# Altium footprint library CubeSat-Backplane.PcbLib: 54 footprints (part 1 of 4)
Each footprint in its own frame and in the unit in brackets; x right, y up, seen from the top. Pads: shape width x height; smd on the part's side, far side on the other; paste and mask are expansions set on the pad; w line width, h text height; cw(c..) or ccw(c..) is an arc to the next point about the centre after c.
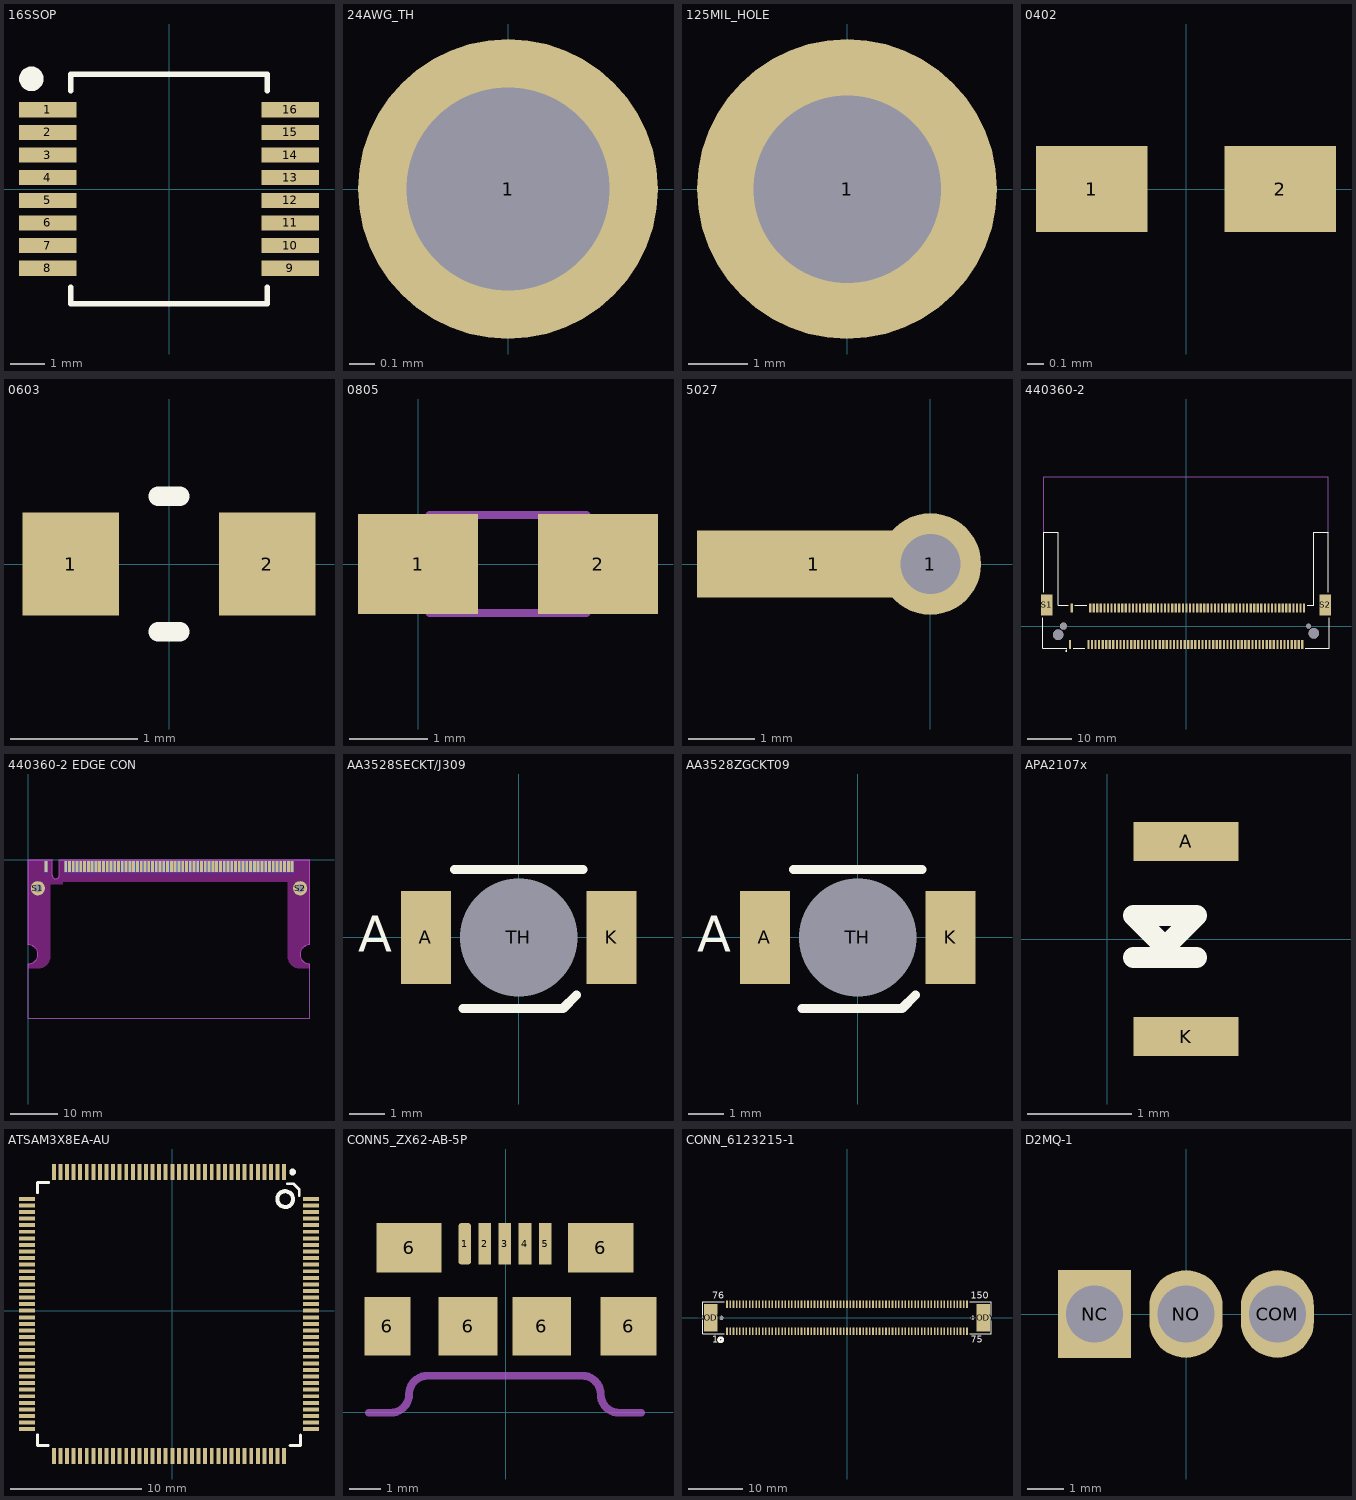
[diagram p0: the footprints below, top view; thin cyan lines are the x and y axes]

## 16SSOP [mil] "16-SSOP (0.209\", 5.30mm Width)"
height 43.31
pads (16):
  rect 65x17 smd mask+2.36: 1(-137,89.57) 2(-137,63.98) 3(-137,38.39) 4(-137,12.8) 5(-137,-12.8) 6(-137,-38.39) 7(-137,-63.98) 8(-137,-89.57) 9(137,-89.57) 10(137,-63.98) 11(137,-38.39) 12(137,-12.8) 13(137,12.8) 14(137,38.39) 15(137,63.98) 16(137,89.57)
Top Overlay:
  circle w19.68: c-155.5,124.49 r3.94
  lines w6: -111,-111.17 -111,-129.5 111,-129.5 111,-111.17 ; -111,111.17 -111,129.5 111,129.5 111,111.17
3D body "21-0056C_16.step": height 79.11, standoff 1, extent -155.5,-124.48 155.52,124.49

## 24AWG_TH [mm] "TH SOLDER PAD FOR 24AWG"
pads (1):
  round 1.2 hole 0.813: 1(0,0)

## 125MIL_HOLE [mm]
pads (1):
  round 5.08 hole 3.175: 1(0,0)

## 0402 [mil]
pads (2):
  rect 26x20 smd: 1(-22,0) 2(22,0)
3D body: height 10, standoff 0, extent 0,0 10,10
3D body "RC0402N.step": height 27.99, standoff 0, extent -20.98,-9.99 20.99,10.01

## 0603 [mil] "Non-polarized"
height 35.43
pads (2):
  rect 29.78x32 smd paste+0 mask+0: 1(-30.39,0) 2(30.39,0)
Top Overlay:
  lines w6: -3.39,-21 3.39,-21 ; -3.39,21 3.39,21
3D body "User Library-res0603-1.step": height 15.75, standoff 0, extent -31.49,-15.74 31.51,15.75
3D body: height 10, standoff 0, extent 0,0 10,10

## 0805 [mil] "Non-Polarized"
pads (2):
  rect 60x50 smd: 1(0,0) 2(90,0)
BOARD CHAMFER:
  lines w4: 5.63,-24.61 5.63,24.61 84.37,24.61 84.37,-24.61 5.63,-24.61
3D body: height 36, standoff 0, extent 5.63,-24.61 84.37,24.61

## 5027 [mm] "PC Test Point, Miniature Phosphor Bronze, Silver Plating Surface Mount, Through Hole Mounting Type"
height 3.05
pads (2):
  rect 3.5x1 smd mask+0: 1(-1.75,0)
  round 1.524 hole 0.9 mask+0.05: 1(0,0)
Top Paste:
  rectangle: -1,-1 1,1
3D body "keystone-PN5027.STEP": height 3.06, standoff -1, extent -3.209,-0.381 0.144,0.381

## 440360-2 [mm] "124 Position SODIMM Fax Modem, Mini PCI Socket Surface Mount, Right Angle"
height 7.95
pads (130):
  rect 0.5x2 smd: 1(-26.05,-4.1) 2(-25.65,4.1) 3(-21.9,-4.1) 4(-21.5,4.1) 5(-21.1,-4.1) 6(-20.7,4.1) 7(-20.3,-4.1) 8(-19.9,4.1) 9(-19.5,-4.1) 10(-19.1,4.1) 11(-18.7,-4.1) 12(-18.3,4.1) 13(-17.9,-4.1) 14(-17.5,4.1) 15(-17.1,-4.1) 16(-16.7,4.1) 17(-16.3,-4.1) 18(-15.9,4.1) 19(-15.5,-4.1) 20(-15.1,4.1) 21(-14.7,-4.1) 22(-14.3,4.1) 23(-13.9,-4.1) 24(-13.5,4.1) 25(-13.1,-4.1) 26(-12.7,4.1) 27(-12.3,-4.1) 28(-11.9,4.1) 29(-11.5,-4.1) 30(-11.1,4.1) 31(-10.7,-4.1) 32(-10.3,4.1) 33(-9.9,-4.1) 34(-9.5,4.1) 35(-9.1,-4.1) 36(-8.7,4.1) 37(-8.3,-4.1) 38(-7.9,4.1) 39(-7.5,-4.1) 40(-7.1,4.1) 41(-6.7,-4.1) 42(-6.3,4.1) 43(-5.9,-4.1) 44(-5.5,4.1) 45(-5.1,-4.1) 46(-4.7,4.1) 47(-4.3,-4.1) 48(-3.9,4.1) 49(-3.5,-4.1) 50(-3.1,4.1) 51(-2.7,-4.1) 52(-2.3,4.1) 53(-1.9,-4.1) 54(-1.5,4.1) 55(-1.1,-4.1) 56(-0.7,4.1) 57(-0.3,-4.1) 58(0.1,4.1) 59(0.5,-4.1) 60(0.9,4.1) 61(1.3,-4.1) 62(1.7,4.1) 63(2.1,-4.1) 64(2.5,4.1) 65(2.9,-4.1) 66(3.3,4.1) 67(3.7,-4.1) 68(4.1,4.1) 69(4.5,-4.1) 70(4.9,4.1) 71(5.3,-4.1) 72(5.7,4.1) 73(6.1,-4.1) 74(6.5,4.1) 75(6.9,-4.1) 76(7.3,4.1) 77(7.7,-4.1) 78(8.1,4.1) 79(8.5,-4.1) 80(8.9,4.1) 81(9.3,-4.1) 82(9.7,4.1) 83(10.1,-4.1) 84(10.5,4.1) 85(10.9,-4.1) 86(11.3,4.1) 87(11.7,-4.1) 88(12.1,4.1) 89(12.5,-4.1) 90(12.9,4.1) 91(13.3,-4.1) 92(13.7,4.1) 93(14.1,-4.1) 94(14.5,4.1) 95(14.9,-4.1) 96(15.3,4.1) 97(15.7,-4.1) 98(16.1,4.1) 99(16.5,-4.1) 100(16.9,4.1) 101(17.3,-4.1) 102(17.7,4.1) 103(18.1,-4.1) 104(18.5,4.1) 105(18.9,-4.1) 106(19.3,4.1) 107(19.7,-4.1) 108(20.1,4.1) 109(20.5,-4.1) 110(20.9,4.1) 111(21.3,-4.1) 112(21.7,4.1) 113(22.1,-4.1) 114(22.5,4.1) 115(22.9,-4.1) 116(23.3,4.1) 117(23.7,-4.1) 118(24.1,4.1) 119(24.5,-4.1) 120(24.9,4.1) 121(25.3,-4.1) 122(25.7,4.1) 123(26.1,-4.1) 124(26.5,4.1)
  round 2.35 hole 2.35 unplated: None(-28.675,-1.93) None(28.675,-1.63)
  round 1.6 hole 1.6 unplated: None(-27.5,0)
  round 1.1 hole 1.1 unplated: None(27.5,0)
  rect 2.5x4.8 smd: S1(-31.25,4.75) S2(31.25,4.75)
Top Overlay:
  circle w0.2: c-26.85,-5.55 r0.1
  lines w0.254: -32.1,1.9 -32.1,-4.97 -26.8,-4.97 ; -31.95,7.65 -31.95,21.03 -28.65,21.03 -28.65,4.65 -26.4,4.65 ; -25.3,-4.97 -22.7,-4.97 ; -24.95,4.65 -22.25,4.65 ; 26.8,-4.97 32.1,-4.97 32.1,1.9 ; 27.2,4.65 28.65,4.65 28.65,21.03 31.95,21.03 31.95,7.65
Mechanical 1:
  lines w0.254: -31.95,21.03 -31.95,33.528 31.95,33.528 31.95,21.03
3D body "c-440360-2-m-3d.stp": height 8.85, standoff -0.59, extent -32.1,-4.975 32.1,20.94

## 440360-2 EDGE CON [mm]
pads (126):
  rect 0.6x2.3 smd: A1(3.75,-1.4) A2(7.9,-1.4) A3(8.7,-1.4) A4(9.5,-1.4) A5(10.3,-1.4) A6(11.1,-1.4) A7(11.9,-1.4) A8(12.7,-1.4) A9(13.5,-1.4) A10(14.3,-1.4) A11(15.1,-1.4) A12(15.9,-1.4) A13(16.7,-1.4) A14(17.5,-1.4) A15(18.3,-1.4) A16(19.1,-1.4) A17(19.9,-1.4) A18(20.7,-1.4) A19(21.5,-1.4) A20(22.3,-1.4) A21(23.1,-1.4) A22(23.9,-1.4) A23(24.7,-1.4) A24(25.5,-1.4) A25(26.3,-1.4) A26(27.1,-1.4) A27(27.9,-1.4) A28(28.7,-1.4) A29(29.5,-1.4) A30(30.3,-1.4) A31(31.1,-1.4) A32(31.9,-1.4) A33(32.7,-1.4) A34(33.5,-1.4) A35(34.3,-1.4) A36(35.1,-1.4) A37(35.9,-1.4) A38(36.7,-1.4) A39(37.5,-1.4) A40(38.3,-1.4) A41(39.1,-1.4) A42(39.9,-1.4) A43(40.7,-1.4) A44(41.5,-1.4) A45(42.3,-1.4) A46(43.1,-1.4) A47(43.9,-1.4) A48(44.7,-1.4) A49(45.5,-1.4) A50(46.3,-1.4) A51(47.1,-1.4) A52(47.9,-1.4) A53(48.7,-1.4) A54(49.5,-1.4) A55(50.3,-1.4) A56(51.1,-1.4) A57(51.9,-1.4) A58(52.7,-1.4) A59(53.5,-1.4) A60(54.3,-1.4) A61(55.1,-1.4) A62(55.9,-1.4)
  rect 0.6x2.3 smd far side: B1(3.75,-1.4) B2(7.9,-1.4) B3(8.7,-1.4) B4(9.5,-1.4) B5(10.3,-1.4) B6(11.1,-1.4) B7(11.9,-1.4) B8(12.7,-1.4) B9(13.5,-1.4) B10(14.3,-1.4) B11(15.1,-1.4) B12(15.9,-1.4) B13(16.7,-1.4) B14(17.5,-1.4) B15(18.3,-1.4) B16(19.1,-1.4) B17(19.9,-1.4) B18(20.7,-1.4) B19(21.5,-1.4) B20(22.3,-1.4) B21(23.1,-1.4) B22(23.9,-1.4) B23(24.7,-1.4) B24(25.5,-1.4) B25(26.3,-1.4) B26(27.1,-1.4) B27(27.9,-1.4) B28(28.7,-1.4) B29(29.5,-1.4) B30(30.3,-1.4) B31(31.1,-1.4) B32(31.9,-1.4) B33(32.7,-1.4) B34(33.5,-1.4) B35(34.3,-1.4) B36(35.1,-1.4) B37(35.9,-1.4) B38(36.7,-1.4) B39(37.5,-1.4) B40(38.3,-1.4) B41(39.1,-1.4) B42(39.9,-1.4) B43(40.7,-1.4) B44(41.5,-1.4) B45(42.3,-1.4) B46(43.1,-1.4) B47(43.9,-1.4) B48(44.7,-1.4) B49(45.5,-1.4) B50(46.3,-1.4) B51(47.1,-1.4) B52(47.9,-1.4) B53(48.7,-1.4) B54(49.5,-1.4) B55(50.3,-1.4) B56(51.1,-1.4) B57(51.9,-1.4) B58(52.7,-1.4) B59(53.5,-1.4) B60(54.3,-1.4) B61(55.1,-1.4) B62(55.9,-1.4)
  round 3 hole 1.8: S1(2,-6) S2(57.6,-6)
Keep-Out Layer:
  region: 6.55,0 6.55,-3.25 6.546,-3.323 6.518,-3.468 6.461,-3.604 6.38,-3.726 6.276,-3.83 6.154,-3.911 6.018,-3.968 5.873,-3.996 5.8,-4 5.726,-3.996 5.582,-3.968 5.446,-3.911 5.324,-3.83 5.22,-3.726 5.139,-3.604 5.082,-3.468 5.054,-3.324 5.05,-3.25 5.05,0 0,0 0,-18 0.196,-18.01 0.581,-18.086 0.943,-18.236 1.269,-18.454 1.546,-18.731 1.764,-19.057 1.914,-19.419 1.99,-19.804 1.99,-20.196 1.914,-20.581 1.764,-20.943 1.546,-21.269 1.269,-21.546 0.943,-21.764 0.581,-21.914 0.196,-21.99 0,-22 0,-23 2.256,-23 2.479,-22.975 2.91,-22.851 3.314,-22.657 3.68,-22.397 3.997,-22.08 4.257,-21.714 4.451,-21.31 4.575,-20.879 4.6,-20.656 4.6,-5.1 7.3,-5.1 7.3,-4.6 55,-4.6 55,-20.656 55.025,-20.879 55.149,-21.31 55.343,-21.714 55.603,-22.08 55.92,-22.397 56.286,-22.657 56.69,-22.851 57.121,-22.975 57.344,-23 59.6,-23 59.6,-22 59.404,-21.991 59.019,-21.914 58.656,-21.765 58.33,-21.547 58.052,-21.27 57.834,-20.943 57.684,-20.581 57.607,-20.196 57.607,-19.804 57.684,-19.419 57.834,-19.057 58.052,-18.73 58.33,-18.453 58.656,-18.235 59.019,-18.086 59.404,-18.009 59.6,-18 59.6,0
Mechanical 1:
  lines w0.254: 0,-23 0,-33.5 59.6,-33.5 59.6,-23 ; 59.6,-23 59.6,-23
Board:
  lines w0.254: 0,-23 0,-22 ; 59.6,-23 59.6,-22 ; 0,-22 ccw(c0,-20) 0,-18 0,0 5.05,0 5.05,-3.25 ccw(c5.8,-3.25) 5.8,-4 ccw(c5.8,-3.25) 6.55,-3.25 6.55,0 59.6,0 59.6,-18 ccw(c59.6,-20) 59.6,-22 ; 0,-22 0,-22 ; 59.6,-22 59.6,-22

## AA3528SECKT/J309 [mm] "Red 625nm LED Indication - Discrete 2.2V 2-SMD, Gull Wing, Reverse Mount"
pads (3):
  rect 1.4x2.6 smd: A(-2.6,0) K(2.6,0)
  round 1.524 hole 3.3 unplated: TH(0,0)
Top Overlay:
  lines w0.254: -1.8,1.9 1.8,1.9 ; -1.56,-1.993 1.24,-1.993 1.616,-1.617
  text "A" at -4.5,-0.4 h1.02
3D body "RED_LED.SLDPRT": height 1.91, standoff 0.01, extent -2.6,-1.403 2.6,1.397

## AA3528ZGCKT09 [mm] "Green 525nm LED Indication - Discrete 2.2V 2-SMD, Gull Wing, Reverse Mount"
pads (3):
  rect 1.4x2.6 smd: A(-2.6,0) K(2.6,0)
  round 1.524 hole 3.3 unplated: TH(0,0)
Top Overlay:
  lines w0.254: -1.8,1.9 1.8,1.9 ; -1.56,-1.993 1.24,-1.993 1.616,-1.617
  text "A" at -4.5,-0.4 h1.02
3D body "GREEN_LED.SLDPRT": height 1.91, standoff 0.01, extent -2.6,-1.403 2.6,1.397

## APA2107x [mm] "Red 625nm LED Indication - Discrete 1.8V 2-SMD, No Lead"
height 0.7
pads (2):
  rect 1x0.37 smd: A(0.75,0.93) K(0.75,-0.93)
Top Overlay:
  lines w0.2: 0.25,-0.175 0.85,-0.175 ; 0.25,0.225 0.85,0.225 0.55,-0.075 0.25,0.225
3D body "APA2107.STEP": height 0.61, standoff 0.01, extent 0,-1.05 1.001,1.05

## ATSAM3X8EA-AU [mm] "IC MCU 32BIT 512KB FLASH 144LQFP"
pads (144):
  rect 0.3x1.2 smd: 1(8.5,10.55) 2(8,10.55) 3(7.5,10.55) 4(7,10.55) 5(6.5,10.55) 6(6,10.55) 7(5.5,10.55) 8(5,10.55) 9(4.5,10.55) 10(4,10.55) 11(3.5,10.55) 12(3,10.55) 13(2.5,10.55) 14(2,10.55) 15(1.5,10.55) 16(1,10.55) 17(0.5,10.55) 18(0,10.55) 19(-0.5,10.55) 20(-1,10.55) 21(-1.5,10.55) 22(-2,10.55) 23(-2.5,10.55) 24(-3,10.55) 25(-3.5,10.55) 26(-4,10.55) 27(-4.5,10.55) 28(-5,10.55) 29(-5.5,10.55) 30(-6,10.55) 31(-6.5,10.55) 32(-7,10.55) 33(-7.5,10.55) 34(-8,10.55) 35(-8.5,10.55) 36(-9,10.55) 73(-9,-11.05) 74(-8.5,-11.05) 75(-8,-11.05) 76(-7.5,-11.05) 77(-7,-11.05) 78(-6.5,-11.05) 79(-6,-11.05) 80(-5.5,-11.05) 81(-5,-11.05) 82(-4.5,-11.05) 83(-4,-11.05) 84(-3.5,-11.05) 85(-3,-11.05) 86(-2.5,-11.05) 87(-2,-11.05) 88(-1.5,-11.05) 89(-1,-11.05) 90(-0.5,-11.05) 91(0,-11.05) 92(0.5,-11.05) 93(1,-11.05) 94(1.5,-11.05) 95(2,-11.05) 96(2.5,-11.05) 97(3,-11.05) 98(3.5,-11.05) 99(4,-11.05) 100(4.5,-11.05) 101(5,-11.05) 102(5.5,-11.05) 103(6,-11.05) 104(6.5,-11.05) 105(7,-11.05) 106(7.5,-11.05) 107(8,-11.05) 108(8.5,-11.05)
  rect 1.2x0.3 smd: 37(-11.05,8.5) 38(-11.05,8) 39(-11.05,7.5) 40(-11.05,7) 41(-11.05,6.5) 42(-11.05,6) 43(-11.05,5.5) 44(-11.05,5) 45(-11.05,4.5) 46(-11.05,4) 47(-11.05,3.5) 48(-11.05,3) 49(-11.05,2.5) 50(-11.05,2) 51(-11.05,1.5) 52(-11.05,1) 53(-11.05,0.5) 54(-11.05,0) 55(-11.05,-0.5) 56(-11.05,-1) 57(-11.05,-1.5) 58(-11.05,-2) 59(-11.05,-2.5) 60(-11.05,-3) 61(-11.05,-3.5) 62(-11.05,-4) 63(-11.05,-4.5) 64(-11.05,-5) 65(-11.05,-5.5) 66(-11.05,-6) 67(-11.05,-6.5) 68(-11.05,-7) 69(-11.05,-7.5) 70(-11.05,-8) 71(-11.05,-8.5) 72(-11.05,-9) 109(10.55,-9) 110(10.55,-8.5) 111(10.55,-8) 112(10.55,-7.5) 113(10.55,-7) 114(10.55,-6.5) 115(10.55,-6) 116(10.55,-5.5) 117(10.55,-5) 118(10.55,-4.5) 119(10.55,-4) 120(10.55,-3.5) 121(10.55,-3) 122(10.55,-2.5) 123(10.55,-2) 124(10.55,-1.5) 125(10.55,-1) 126(10.55,-0.5) 127(10.55,0) 128(10.55,0.5) 129(10.55,1) 130(10.55,1.5) 131(10.55,2) 132(10.55,2.5) 133(10.55,3) 134(10.55,3.5) 135(10.55,4) 136(10.55,4.5) 137(10.55,5) 138(10.55,5.5) 139(10.55,6) 140(10.55,6.5) 141(10.55,7) 142(10.55,7.5) 143(10.55,8) 144(10.55,8.5)
Top Overlay:
  circle w0.305: c8.585,8.484 r0.6
  circle w0.305: c9.144,10.541 r0.102
  lines w0.203: -10.25,-9.423 -10.25,-10.25 -9.423,-10.25 ; -10.25,8.975 -10.25,9.75 -9.4,9.75 ; 8.75,9.648 9.198,9.648 9.648,9.198 9.648,8.75 ; 8.941,-10.25 9.75,-10.25 9.75,-9.449
3D body "LQFP144-L.stp": height 1.45, standoff 0, extent -11.256,-11.256 10.744,10.744

## CONN5_ZX62-AB-5P [mil]
pads (11):
  rrect50% 16x53 smd paste+0 mask+0: 1(-52.18,214.5)
  rect 16x53 smd paste+0 mask+0: 2(-26.59,214.5) 3(-1,214.5) 4(24.59,214.5) 5(50.18,214.5)
  rect 59.06x75 smd: 6(-150.63,109.5)
  rect 83x63 smd: 6(-123,209.5) 6(121,209.5)
  rect 75x75 smd: 6(-48,109.5) 6(46,109.5)
  rect 71x75 smd: 6(156.5,109.5)
Board:
  lines w10: -174.49,-0.74 -146.67,-0.74 ccw(c-146.67,22.89) -123.05,22.89 cw(c-99.43,22.89) -99.43,46.51 97.43,46.51 cw(c97.43,22.89) 121.05,22.89 ccw(c144.67,22.89) 144.67,-0.74 172.49,-0.74
3D body "ZX62-AB-5PA.stp": height 109.56, standoff -6.59, extent -173.23,0 173.23,220.48
3D body: height 10, standoff 0, extent 50.18,214.5 60.18,224.5

## CONN_6123215-1 [mil] "150 Position Female Connector Non Specified - Dual Edge Gold 0.024\" (0.60mm)"
height 200
pads (154):
  rect 12x55 smd: 1(-874.02,-98.42) 2(-850.39,-98.42) 3(-826.77,-98.42) 4(-803.15,-98.42) 5(-779.53,-98.42) 6(-755.91,-98.42) 7(-732.28,-98.42) 8(-708.66,-98.42) 9(-685.04,-98.42) 10(-661.42,-98.42) 11(-637.8,-98.42) 12(-614.17,-98.42) 13(-590.55,-98.42) 14(-566.93,-98.42) 15(-543.31,-98.42) 16(-519.69,-98.42) 17(-496.06,-98.42) 18(-472.44,-98.42) 19(-448.82,-98.42) 20(-425.2,-98.42) 21(-401.57,-98.42) 22(-377.95,-98.42) 23(-354.33,-98.42) 24(-330.71,-98.42) 25(-307.09,-98.42) 26(-283.46,-98.42) 27(-259.84,-98.42) 28(-236.22,-98.42) 29(-212.6,-98.42) 30(-188.98,-98.42) 31(-165.35,-98.42) 32(-141.73,-98.42) 33(-118.11,-98.42) 34(-94.49,-98.42) 35(-70.87,-98.42) 36(-47.24,-98.42) 37(-23.62,-98.42) 38(0,-98.42) 39(23.62,-98.42) 40(47.24,-98.42) 41(70.87,-98.42) 42(94.49,-98.42) 43(118.11,-98.42) 44(141.73,-98.42) 45(165.35,-98.42) 46(188.98,-98.42) 47(212.6,-98.42) 48(236.22,-98.42) 49(259.84,-98.42) 50(283.46,-98.42) 51(307.09,-98.42) 52(330.71,-98.42) 53(354.33,-98.42) 54(377.95,-98.42) 55(401.57,-98.42) 56(425.2,-98.42) 57(448.82,-98.42) 58(472.44,-98.42) 59(496.06,-98.42) 60(519.68,-98.42) 61(543.31,-98.42) 62(566.93,-98.42) 63(590.55,-98.42) 64(614.17,-98.42) 65(637.8,-98.42) 66(661.42,-98.42) 67(685.04,-98.42) 68(708.66,-98.42) 69(732.28,-98.42) 70(755.91,-98.42) 71(779.53,-98.42) 72(803.15,-98.42) 73(826.77,-98.42) 74(850.39,-98.42) 75(874.02,-98.42) 76(-874.02,98.43) 77(-850.39,98.43) 78(-826.77,98.43) 79(-803.15,98.43) 80(-779.53,98.43) 81(-755.91,98.43) 82(-732.28,98.43) 83(-708.66,98.43) 84(-685.04,98.43) 85(-661.42,98.43) 86(-637.8,98.43) 87(-614.17,98.43) 88(-590.55,98.43) 89(-566.93,98.43) 90(-543.31,98.43) 91(-519.69,98.43) 92(-496.06,98.43) 93(-472.44,98.43) 94(-448.82,98.43) 95(-425.2,98.43) 96(-401.57,98.43) 97(-377.95,98.43) 98(-354.33,98.43) 99(-330.71,98.43) 100(-307.09,98.43) 101(-283.46,98.43) 102(-259.84,98.43) 103(-236.22,98.43) 104(-212.6,98.43) 105(-188.98,98.43) 106(-165.35,98.43) 107(-141.73,98.43) 108(-118.11,98.43) 109(-94.49,98.43) 110(-70.87,98.43) 111(-47.24,98.43) 112(-23.62,98.43) 113(0,98.43) 114(23.62,98.43) 115(47.24,98.43) 116(70.87,98.43) 117(94.49,98.43) 118(118.11,98.43) 119(141.73,98.43) 120(165.35,98.43) 121(188.98,98.43) 122(212.6,98.43) 123(236.22,98.43) 124(259.84,98.43) 125(283.46,98.43) 126(307.09,98.43) 127(330.71,98.43) 128(354.33,98.43) 129(377.95,98.43) 130(401.57,98.43) 131(425.2,98.43) 132(448.82,98.43) 133(472.44,98.43) 134(496.06,98.43) 135(519.68,98.43) 136(543.31,98.43) 137(566.93,98.43) 138(590.55,98.43) 139(614.17,98.43) 140(637.8,98.43) 141(661.42,98.43) 142(685.04,98.43) 143(708.66,98.43) 144(732.28,98.43) 145(755.91,98.43) 146(779.53,98.43) 147(803.15,98.43) 148(826.77,98.43) 149(850.39,98.43) 150(874.02,98.43)
  round 31 hole 31: 151(-915,0) 152(915,0)
  rect 100x200 smd: BODY(-992,0) BODY(992,0)
Top Layer:
  region: -837,157
  lines w10: -874.02,98.43 -874,98.43
Top Overlay:
  circle w20: c-920,-160 r15
  lines w6: -893.12,-117 -1050.98,-117 -1050.98,117 -893.12,117 ; 893.12,-117 1049.02,-117 1049.02,117 893.12,117
  text "150" at 900,140 h50
  text "75" at 900,-180 h50
  text "76" at -980,140 h50
  text "1" at -980,-180 h50
Mechanical 1:
  region: -1010,235
3D body "c-6123215-1-b-3d.stp": height 199.32, standoff -17.22, extent -994.1,-114.17 994.09,114.18

## D2MQ-1 [mm] "Switch SPDT Through Hole"
height 8.7
pads (3):
  oval 2x2.4 hole 1.55: COM(2.5,0) NO(0,0)
  rect 2x2.4 hole 1.55: NC(-2.5,0)
Bottom Overlay:
  lines w0.254: -3.75,-1.35 -4.1,-1.35 -4.1,1.35 -3.75,1.35 ; 3.75,-1.35 4.1,-1.35 4.1,1.35 3.75,1.35
3D body "D2MQ_1.step": height 7.71, standoff -3.39, extent -4.1,-1.35 4.1,1.35